# Altium footprint library std-th.PcbLib: 171 footprints (part 4 of 11)
Each footprint in its own frame and in the unit in brackets; x right, y up, seen from the top. Pads: shape width x height; smd on the part's side, far side on the other; paste and mask are expansions set on the pad; w line width, h text height; cw(c..) or ccw(c..) is an arc to the next point about the centre after c.
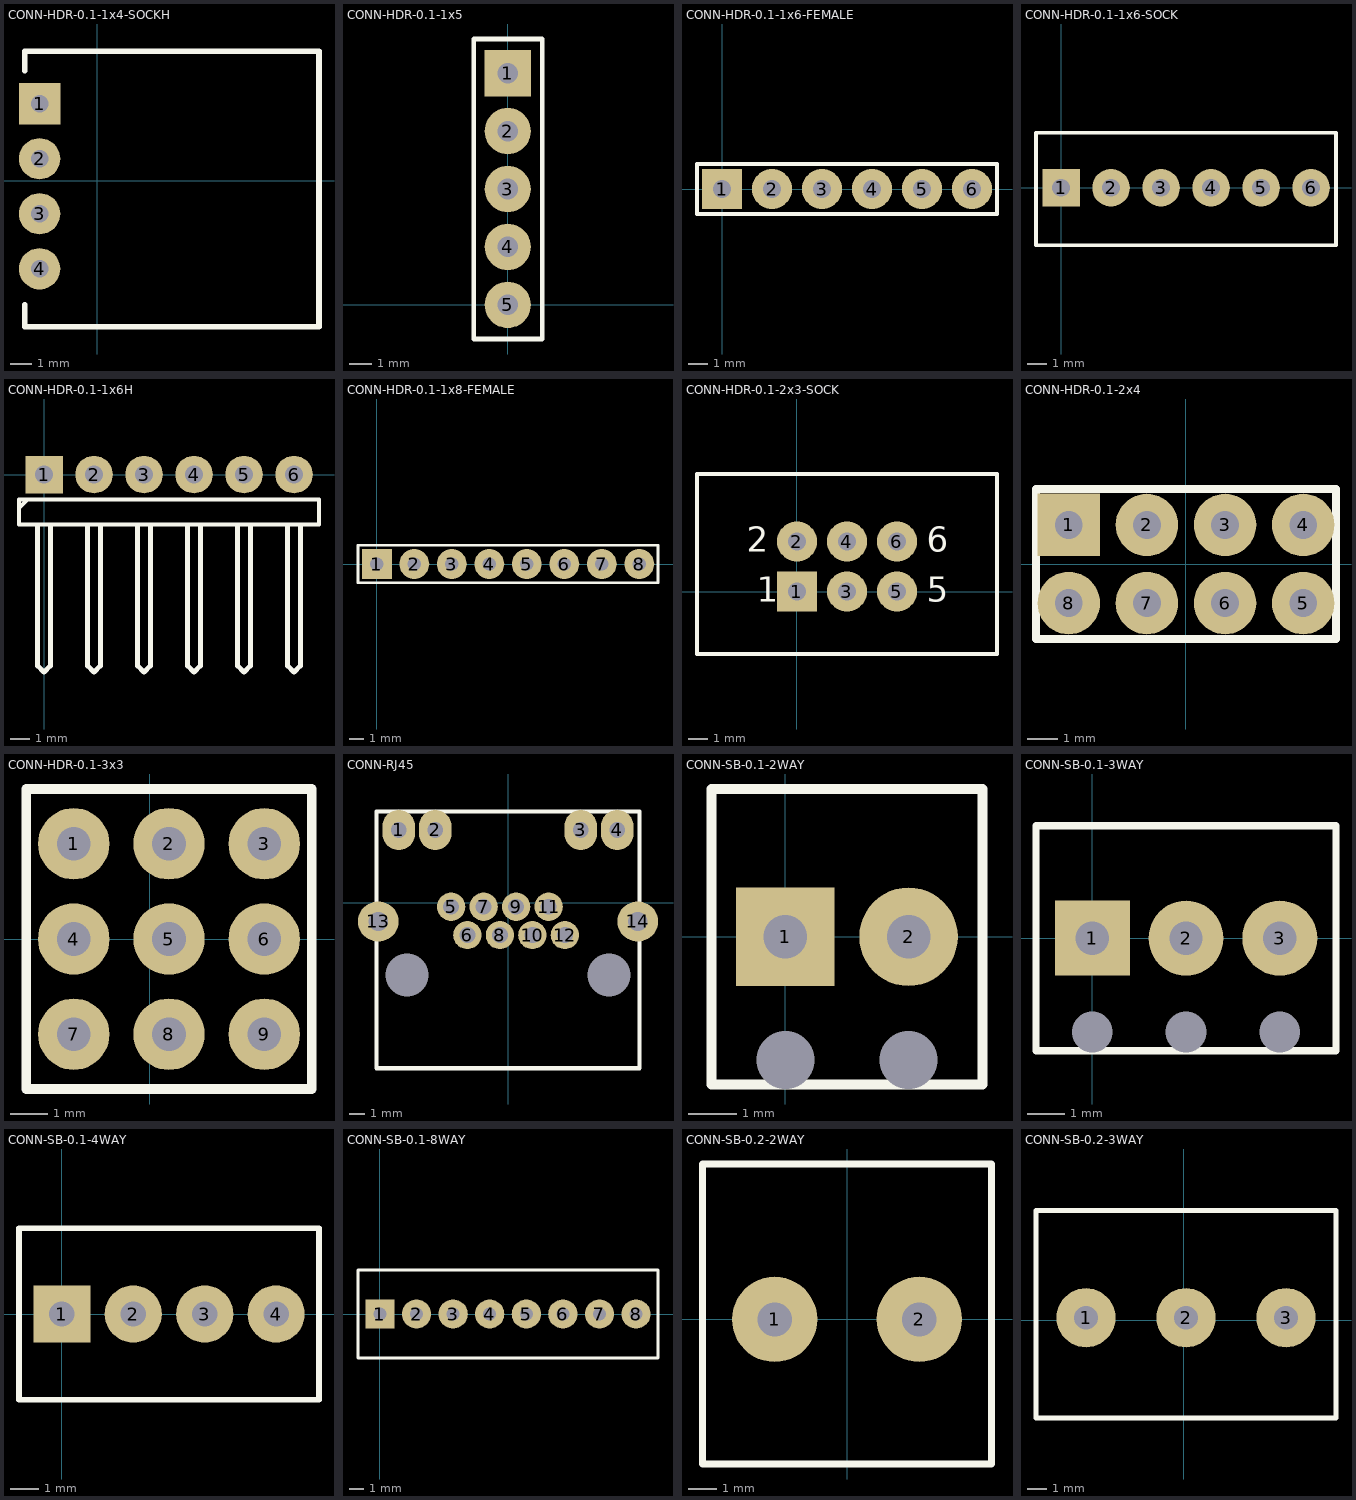
[diagram p3: the footprints below, top view; thin cyan lines are the x and y axes]

## CONN-HDR-0.1-1x4-SOCKH [mil] "Header, socket, 1 row 4 way, right angle"
pads (4):
  rect 75x75 hole 31.5: 1(-105,140)
  round 75 hole 31.5: 2(-105,40) 3(-105,-60) 4(-105,-160)
Top Overlay:
  lines w10: -132.5,-225 -132.5,-264.99 402.5,-264.99 402.5,235.01 -132.5,235.01 -132.5,200
3D body "User Library-Molex SDA-70553.step": height 275, standoff -130, extent -132.5,-264.99 402.5,235.01

## CONN-HDR-0.1-1x5 [mil] "Header, 100 mil pitch, 5 way"
height 393.7
pads (5):
  rect 80x80 hole 35.43: 1(0,400)
  round 80 hole 35.43: 2(0,300) 3(0,200) 4(0,100) 5(0,0)
Top Overlay:
  lines w8: -59,-59 59.85,-59 59.85,459 -59,459 -59,-59
3D body "User Library-PinHeaderX5-1.STEP": height 335.04, standoff -144.88, extent -55.12,-49.99 59.85,450.01

## CONN-HDR-0.1-1x6-FEMALE [mil] "Female header, 100 mil pitch, 6 way single row"
height 393.7
pads (6):
  rect 80x80 hole 35.43: 1(0,0)
  round 80 hole 35.43: 2(100,0) 3(200,0) 4(300,0) 5(400,0) 6(500,0)
Top Overlay:
  lines w7.87: -50,-50 550,-50 550,50 -50,50 -50,-50
3D body "User Library-PIN HEADER FEMALE 6.step": height 326.77, standoff 0, extent -50,-50 550,50
3D body: height 0, standoff -590.55, extent -11.71,-11.78 11.82,11.79
3D body: height 0, standoff -590.55, extent 88.29,-11.78 111.82,11.79
3D body: height 0, standoff -590.55, extent 188.29,-11.79 211.82,11.79
3D body: height 0, standoff -590.55, extent 288.24,-23.58 311.76,0
3D body: height 0, standoff -590.55, extent 388.29,-11.78 411.82,11.79
3D body: height 0, standoff -590.55, extent 488.29,-11.78 511.82,11.8

## CONN-HDR-0.1-1x6-SOCK [mm] "Connector; Header; 6 Position"
height 6.35
pads (6):
  rect 1.905x1.905 hole 0.9: 1(0,0)
  round 1.905 hole 0.9: 2(2.54,0) 3(5.08,0) 4(7.62,0) 5(10.16,0) 6(12.7,0)
Top Overlay:
  lines w0.2: -1.27,-2.921 -1.27,2.794 13.97,2.794 13.97,-2.921 -1.27,-2.921
3D body "User Library-molex kk 0_1in latching 6 way vertical header.step": height 11.8, standoff -3.44, extent -1.27,-2.972 13.97,2.87

## CONN-HDR-0.1-1x6H [mm] "Connector; Header; 6 Position; Right Angle"
height 2
pads (6):
  rect 1.905x1.905 hole 0.9: 1(0,0)
  round 1.905 hole 0.9: 2(2.54,0) 3(5.08,0) 4(7.62,0) 5(10.16,0) 6(12.7,0)
Top Overlay:
  lines w0.2: -1.27,-1.693 -0.847,-1.27 ; -1.27,-2.54 -1.27,-1.27 13.97,-1.27 13.97,-2.54 -1.27,-2.54
  lines w0.254: -0.32,-2.606 -0.32,-9.64 -0.32,-9.719 0,-10.04 0.32,-9.72 0.32,-9.64 0.32,-2.606 ; 2.22,-2.606 2.22,-9.641 2.22,-9.72 2.54,-10.04 2.86,-9.72 2.86,-9.641 2.86,-2.606 ; 4.76,-2.606 4.76,-9.64 4.76,-9.719 5.08,-10.04 5.4,-9.72 5.4,-9.64 5.4,-2.606 ; 7.3,-2.606 7.3,-9.64 7.3,-9.719 7.62,-10.04 7.94,-9.72 7.94,-9.64 7.94,-2.606 ; 9.84,-2.606 9.84,-9.64 9.84,-9.719 10.16,-10.04 10.48,-9.72 10.48,-9.64 10.48,-2.606 ; 12.38,-2.607 12.38,-9.641 12.38,-9.72 12.7,-10.041 13.02,-9.721 13.02,-9.641 13.02,-2.607
3D body "User Library-Header90-1.step": height 2.54, standoff -3, extent -1.27,-10.04 1.27,0.32
3D body "User Library-Header90-1.step": height 2.54, standoff -3, extent 1.27,-10.04 3.81,0.32
3D body "User Library-Header90-1.step": height 2.54, standoff -3, extent 3.81,-10.04 6.35,0.32
3D body "User Library-Header90-1.step": height 2.54, standoff -3, extent 6.35,-10.04 8.89,0.32
3D body "User Library-Header90-1.step": height 2.54, standoff -3, extent 8.89,-10.04 11.43,0.32
3D body "User Library-Header90-1.step": height 2.54, standoff -3, extent 11.43,-10.04 13.97,0.32

## CONN-HDR-0.1-1x8-FEMALE [mil] "Female header, 100 mil pitch, 8 way single row"
height 78.74
pads (8):
  rect 80x80 hole 35.43: 1(0,0)
  round 80 hole 35.43: 2(100,0) 3(200,0) 4(300,0) 5(400,0) 6(500,0) 7(600,0) 8(700,0)
Top Overlay:
  lines w7.87: -50,-50 -50,50 750,50 750,-50 -50,-50
3D body "User Library-PIN HEADER FEMALE 8.step": height 326.77, standoff 0, extent -49.99,-49.99 750.01,50.01
3D body: height 0, standoff -590.55, extent -11.71,-11.78 11.82,11.79
3D body: height 0, standoff -590.55, extent 88.29,-11.78 111.82,11.79
3D body: height 0, standoff -590.55, extent 188.29,-11.78 211.82,11.8
3D body: height 0, standoff -590.55, extent 288.29,-11.79 311.82,11.79
3D body: height 0, standoff -590.55, extent 388.24,-23.58 411.76,0
3D body: height 0, standoff -590.55, extent 488.29,-11.79 511.82,11.79
3D body: height 0, standoff -590.55, extent 588.29,-11.78 611.82,11.79
3D body: height 0, standoff -590.55, extent 688.29,-11.78 711.82,11.79

## CONN-HDR-0.1-2x3-SOCK [mil] "Connector; Header; 3x2 Position"
height 179.92
pads (6):
  rect 80x80 hole 35.43: 1(0,0)
  round 80 hole 35.43: 2(0,100) 3(100,0) 4(100,100) 5(200,0) 6(200,100)
Top Overlay:
  lines w7.87: -199.99,-125 400.01,-125 400.01,235 -199.99,235 -199.99,-125
  text "1" at -80,-20 h50
  text "2" at -100,80 h50
  text "5" at 260,-20 h50
  text "6" at 260,80 h50
3D body "User Library-LP06V.STEP": height 372.83, standoff -125.98, extent -199.99,-125.19 400.01,237.02

## CONN-HDR-0.1-2x4 [mil] "Header, 8 way, 100 mil pitch"
height 393.7
pads (8):
  rect 80x80 hole 35.43: 1(-150,50)
  round 80 hole 35.43: 2(-50,50) 3(50,50) 4(150,50) 5(150,-50) 6(50,-50) 7(-50,-50) 8(-150,-50)
Top Overlay:
  lines w10: -191.99,-95.99 192.01,-95.99 192.01,96.01 -191.99,96.01 -191.99,-95.99
3D body "User Library-Header 4 Vertical.step": height 320, standoff -107, extent -191.99,-95.99 192.01,-3.99
3D body "User Library-Header 4 Vertical.step": height 320, standoff -107, extent -191.99,4.01 192.01,96.01

## CONN-HDR-0.1-3x3 [mil] "Header, 3 row, 9 way, 100 mil pitch"
height 393.7
pads (9):
  round 75 hole 35.43: 1(-80,100) 2(20,100) 3(120,100) 4(-80,0) 5(20,0) 6(120,0) 7(-80,-100) 8(20,-100) 9(120,-100)
Top Overlay:
  lines w10: -129.99,-157.48 -129.99,157.49 170.01,157.49 170.01,-157.48 -129.99,-157.48
3D body "User Library-PinHeaderX3.STEP": height 335.04, standoff -144.88, extent -129.99,-57.48 170.01,57.49
3D body "User Library-PinHeaderX3.STEP": height 335.04, standoff -144.88, extent -129.99,-157.48 170.01,-42.51
3D body "User Library-PinHeaderX3.STEP": height 335.04, standoff -144.88, extent -129.99,42.52 170.01,157.49

## CONN-RJ45 [mil] "Connector, receptable, RJ45 Ethernet"
height 393.7
pads (16):
  oval 80x100 hole 39.37: 1(-270.08,179.58) 2(-179.92,179.58) 3(179.92,179.58) 4(270.08,179.58)
  round 70 hole 39.37: 5(-140.55,-10.18) 6(-100.39,-80.26) 7(-60.23,-10.18) 8(-19.99,-80.26) 9(20.08,-10.18) 10(60.23,-80.26) 11(100.39,-10.18) 12(140.55,-80.26)
  round 100 hole 47.24: 13(-320.84,-46.71) 14(320.84,-46.71)
  round 0 hole 106.3 unplated: 15(-249.99,-179.58) 16(250.01,-179.58)
Top Overlay:
  lines w10: -324.79,-409.58 324.81,-409.58 324.81,224.87 -324.79,224.87 -324.79,-409.58
3D body "User Library-481460010.step": height 547.58, standoff -144.79, extent -324.79,-409.58 324.81,224.87

## CONN-SB-0.1-2WAY [mil] "Screw Terminal Block, 1 row 2 way, 100 mil pitch"
height 250
pads (4):
  round 0 hole 47.24: 0(0,-100) 0(100,-100)
  rect 80x80 hole 35.43: 1(0,0)
  round 80 hole 35.43: 2(100,0)
Top Overlay:
  lines w7.87: -60,-120 160,-120 160,120 -60,120 -60,-120
3D body "13996.stp": height 334.65, standoff -137.8, extent -59.05,-122.04 159.06,122.06

## CONN-SB-0.1-3WAY [mil] "Screw Terminal Block, 1 row 3 way, 100 mil pitch"
height 250
pads (6):
  round 0 hole 43.31: 0(0,-100) 0(100,-100) 0(200,-100)
  rect 80x80 hole 35.43: 1(0,0)
  round 80 hole 35.43: 2(100,0) 3(200,0)
Top Overlay:
  lines w7.87: -60,-120 260,-120 260,120 -60,120 -60,-120
3D body "13997.stp": height 334.65, standoff -137.8, extent -59.05,-122.05 259.06,122.05

## CONN-SB-0.1-4WAY [mil] "Screw Terminal Block, 1 row 4 way, 100 mil pitch"
height 250
pads (4):
  rect 80x80 hole 35.43: 1(0,0)
  round 80 hole 35.43: 2(100,0) 3(200,0) 4(300,0)
Top Overlay:
  lines w7.87: -60,-120 -60,120 360,120 360,-120 -60,-120
3D body "13998.stp": height 334.65, standoff -137.8, extent -59.05,-122.04 359.06,122.05

## CONN-SB-0.1-8WAY [mil] "Screw Terminal Block, 1 row 8 way, 100 mil pitch"
height 250
pads (8):
  rect 80x80 hole 35.43: 1(0,0)
  round 80 hole 35.43: 2(100,0) 3(200,0) 4(300,0) 5(400,0) 6(500,0) 7(600,0) 8(700,0)
Top Overlay:
  lines w7.87: -60,-120 760,-120 760,120 -60,120 -60,-120
3D body "14002.stp": height 334.65, standoff -137.8, extent -59.05,-122.05 759.06,122.05

## CONN-SB-0.2-2WAY [mm] "Screw Terminal Block, 1 row 2 way, 5.08 mm pitch"
height 10
pads (2):
  round 3 hole 1.2: 1(-2.54,0) 2(2.54,0)
Top Overlay:
  lines w0.254: -5.08,-5.08 -5.08,5.461 5.08,5.461 5.08,-5.08 -5.08,-5.08
3D body "User Library-klema-5mm-2pin.step": height 14, standoff -4, extent -5.047,-5.039 4.953,5.461

## CONN-SB-0.2-3WAY [mm] "Screw Terminal Block, 1 row 3 way, 5.08 mm pitch"
height 10
pads (3):
  round 3 hole 1.2: 1(-4.953,0.127) 2(0.127,0.127) 3(5.207,0.127)
Top Overlay:
  lines w0.254: -7.493,-4.953 -7.493,5.588 7.747,5.588 7.747,-4.953 -7.493,-4.953
3D body "User Library-klema-5mm-3pin.step": height 14, standoff -4, extent -7.348,-4.899 7.652,5.601